# Altium footprint library Vowstar_Module.PcbLib: 57 footprints (part 2 of 4)
Each footprint in its own frame and in the unit in brackets; x right, y up, seen from the top. Pads: shape width x height; smd on the part's side, far side on the other; paste and mask are expansions set on the pad; w line width, h text height; cw(c..) or ccw(c..) is an arc to the next point about the centre after c.
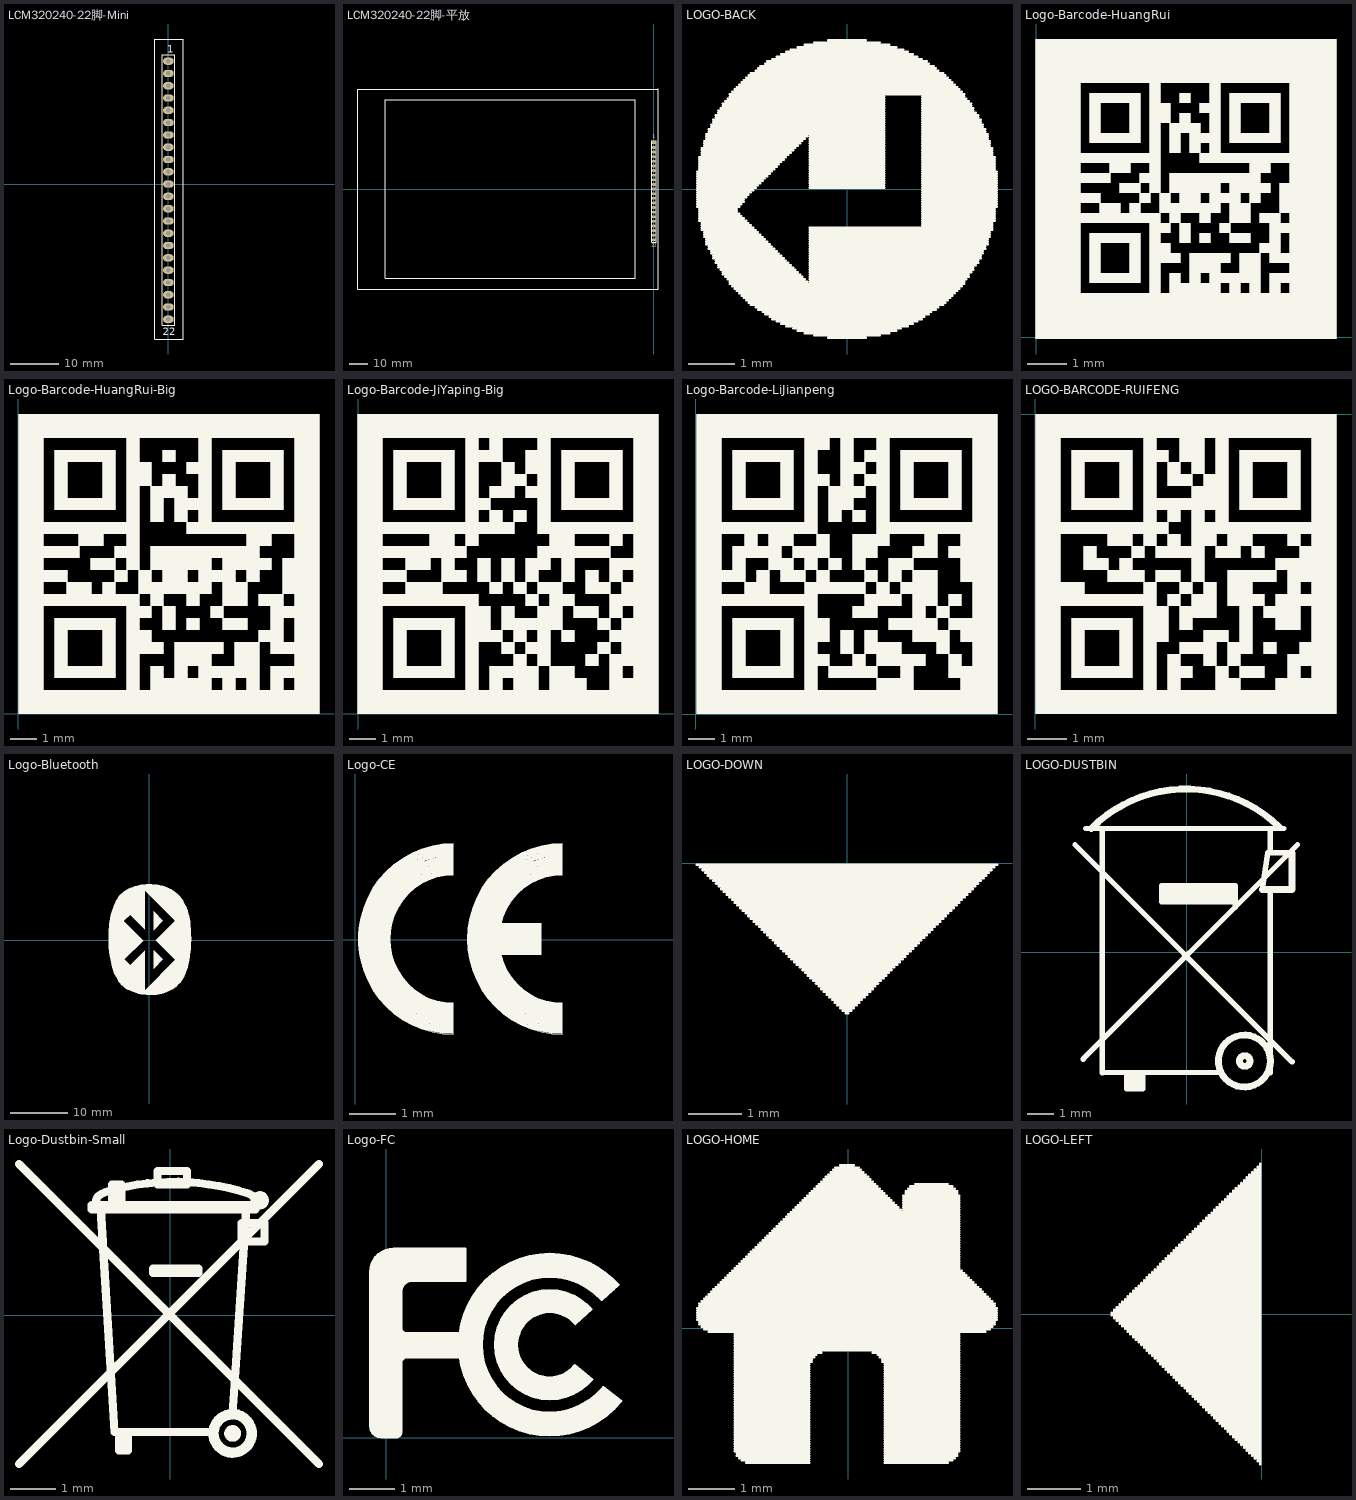
[diagram p1: the footprints below, top view; thin cyan lines are the x and y axes]

## LCM320240-22脚-Mini [mm] "LCM320240-22脚"
height 7.62
pads (22):
  oval 2.2x1.5 hole 0.9: 1(0,25.4) 2(0,22.86) 3(0,20.32) 4(0,17.78) 5(0,15.24) 6(0,12.7) 7(0,10.16) 8(0,7.62) 9(0,5.08) 10(0,2.54) 11(0,0) 12(0,-2.54) 13(0,-5.08) 14(0,-7.62) 15(0,-10.16) 16(0,-12.7) 17(0,-15.24) 18(0,-17.78) 19(0,-20.32) 20(0,-22.86) 21(0,-25.4) 22(0,-27.94)
Top Overlay:
  lines w0.2: -1.27,-29.21 1.27,-29.21 1.27,26.67 -1.27,26.67 -1.27,-29.21
  lines w0.254: -2.794,-32.004 -2.794,29.972 3.048,29.972 3.048,-32.004 -2.794,-32.004
  text "1" at -0.254,27.178 h1.52
  text "22" at -1.143,-31.242 h1.52

## LCM320240-22脚-平放 [mm] "LCM320240-22脚-平放"
height 7.62
pads (22):
  oval 2.2x1.5 hole 0.9: 1(0,25.4) 2(0,22.86) 3(0,20.32) 4(0,17.78) 5(0,15.24) 6(0,12.7) 7(0,10.16) 8(0,7.62) 9(0,5.08) 10(0,2.54) 11(0,0) 12(0,-2.54) 13(0,-5.08) 14(0,-7.62) 15(0,-10.16) 16(0,-12.7) 17(0,-15.24) 18(0,-17.78) 19(0,-20.32) 20(0,-22.86) 21(0,-25.4) 22(0,-27.94)
Top Overlay:
  lines w0.2: -1.27,-29.21 -1.27,26.67 1.27,26.67 1.27,-29.21 -1.27,-29.21
  lines w0.254: -162.714,-55.009 -162.714,54.991 2.286,54.991 ; -162.714,-54.991 2.286,-54.991 2.286,55.049 ; -147.828,-49.149 -10.287,-49.149 -10.287,49.149 -147.828,49.149 -147.828,-49.149
  text "1" at -0.508,28.321 h1.52
  text "22" at -1.143,-31.75 h1.52

## LOGO-BACK [mm] "LOGO-BACK"
Top Overlay:
  drawing of 231 lines, arcs and shapes, not listed

## Logo-Barcode-HuangRui [mm] "Logo-Barcode-HuangRui"
Top Overlay:
  drawing of 710 lines, arcs and shapes, not listed

## Logo-Barcode-HuangRui-Big [mm] "Logo-Barcode-HuangRui"
Top Overlay:
  drawing of 822 lines, arcs and shapes, not listed

## Logo-Barcode-JiYaping-Big [mm] "Logo-Barcode-JiYaping"
Top Overlay:
  drawing of 858 lines, arcs and shapes, not listed

## Logo-Barcode-LiJianpeng [mm] "Logo-Barcode-LiJianpeng"
Top Overlay:
  drawing of 858 lines, arcs and shapes, not listed

## LOGO-BARCODE-RUIFENG [mm] "LOGO-BARCODE-RUIFENG"
Top Overlay:
  drawing of 858 lines, arcs and shapes, not listed

## Logo-Bluetooth [mm] "Logo-Bluetooth"
Top Overlay:
  region: 0.762,5.029 0.762,1.778 2.388,3.404
  region: 0.762,-1.676 0.762,-4.928 2.388,-3.302
  region: -1.041,-0.025 -4.394,-3.378 -4.394,3.327
  region: -4.343,-3.277 -3.2,-4.42 -4.343,-4.42
  region: -3.2,4.521 -4.445,3.277 -4.445,4.521
  region: -4.115,5.283 -0.762,8.687 -0.762,1.93
  region: -4.115,-5.182 -0.762,-1.829 -0.762,-8.534
  region: 1.118,0.051 4.496,3.429 4.572,-3.404
  region: -0.864,-8.788 4.623,-3.302 3.378,-7.417
  region: 4.648,3.251 -0.838,8.738 3.277,7.493
  region: -0.406,9.627 -2.769,9.144 -4.42,8.204 -5.232,7.315 -5.994,6.096 -6.299,5.258 -6.629,4.089 -6.731,3.048 -6.909,1.727 -6.858,-1.321 -6.655,-2.819 -6.274,-4.801 -5.817,-6.045 -4.877,-7.468 -3.886,-8.255 -1.778,-9.22 -0.737,-9.322 -0.762,-8.484 -3.327,-4.343 -4.394,-3.251 -4.394,3.632 -2.997,4.699 -0.737,8.738 -0.406,9.601
  region: -1.194,-9.22 -0.508,-9.322 0.762,-9.347 1.753,-9.246 3.048,-8.865 3.912,-8.458 4.674,-7.849 5.385,-7.061 6.02,-6.071 6.528,-4.597 6.883,-3.277 7.112,-1.549 7.163,0.33 7.087,1.803 7.01,3.073 6.807,4.191 6.553,5.232 6.147,6.172 5.588,7.137 5.029,7.772 4.42,8.306 3.277,8.992 2.388,9.296 1.6,9.474 0.508,9.601 -0.178,9.627 -0.889,9.55 -0.889,8.814 0.279,7.899 4.521,3.607 4.445,3.2 2.388,0.483 4.597,-3.404
  lines w0.254: -6.934,0.203 ccw(c11.215,0.203) -6.231,-4.801 ; -6.935,0.267 cw(c11.214,0.267) -6.231,5.27 ; -6.569,-0.24 cw(c2.959,1.968) -5.58,6.737 ; -6.248,5.182 cw(c-0.978,4.077) -0.939,9.462 ; -6.172,-4.851 ccw(c-0.902,-3.746) -0.862,-9.131 ; -5.805,-5.937 cw(c0.597,-2.756) -5.537,0.914 ; -5.461,-5.613 ccw(c-2.007,-5.385) -1.778,-8.839 ; -4.14,8.458 cw(c0,1.676) 3.281,8.913 ; -4.013,-8.204 ccw(c0.025,-1.549) 3.578,-8.476 ; 0.076,-9.296 ccw(c0.762,-3.505) 6.553,-4.191 ; 1.041,9.55 cw(c0.724,3.569) 6.706,3.251 ; 4.572,-4.801 ccw(c0.8,0.318) 5.918,4.089 ; 5.621,-6.726 ccw(c-0.889,-2.489) 6.477,-0.025 ; 5.976,6.41 cw(c-2.654,1.867) 7.061,2.718 ; 6.477,-4.75 ccw(c-1.778,-1.803) 6.672,0.527 ; 6.745,-3.718 ccw(c-7.68,-0.33) 7.137,-0.33 ; 6.745,4.226 cw(c-7.68,0.838) 7.137,0.838

## Logo-CE [mm] "Logo-CE"
Top Overlay:
  drawing of 615 lines, arcs and shapes, not listed

## LOGO-DOWN [mm] "LOGO-DOWN"
Top Overlay:
  lines w0.051: -2.819,-0.025 2.819,-0.025 ; -2.769,-0.076 2.769,-0.076 ; -2.718,-0.127 2.718,-0.127 ; -2.667,-0.178 2.667,-0.178 ; -2.616,-0.229 2.616,-0.229 ; -2.565,-0.279 2.565,-0.279 ; -2.515,-0.33 2.515,-0.33 ; -2.464,-0.381 2.464,-0.381 ; -2.413,-0.432 2.413,-0.432 ; -2.362,-0.483 2.362,-0.483 ; -2.311,-0.533 2.311,-0.533 ; -2.261,-0.584 2.261,-0.584 ; -2.21,-0.635 2.21,-0.635 ; -2.159,-0.686 2.159,-0.686 ; -2.108,-0.737 2.108,-0.737 ; -2.057,-0.787 2.057,-0.787 ; -2.007,-0.838 2.007,-0.838 ; -1.956,-0.889 1.956,-0.889 ; -1.905,-0.94 1.905,-0.94 ; -1.854,-0.991 1.854,-0.991 ; -1.803,-1.041 1.803,-1.041 ; -1.753,-1.092 1.753,-1.092 ; -1.702,-1.143 1.702,-1.143 ; -1.651,-1.194 1.651,-1.194 ; -1.6,-1.245 1.6,-1.245 ; -1.549,-1.295 1.549,-1.295 ; -1.499,-1.346 1.499,-1.346 ; -1.448,-1.397 1.448,-1.397 ; -1.397,-1.448 1.397,-1.448 ; -1.346,-1.499 1.346,-1.499 ; -1.295,-1.549 1.295,-1.549 ; -1.245,-1.6 1.245,-1.6 ; -1.194,-1.651 1.194,-1.651 ; -1.143,-1.702 1.143,-1.702 ; -1.092,-1.753 1.092,-1.753 ; -1.041,-1.803 1.041,-1.803 ; -0.991,-1.854 0.991,-1.854 ; -0.94,-1.905 0.94,-1.905 ; -0.889,-1.956 0.889,-1.956 ; -0.838,-2.007 0.838,-2.007 ; -0.787,-2.057 0.787,-2.057 ; -0.737,-2.108 0.737,-2.108 ; -0.686,-2.159 0.686,-2.159 ; -0.635,-2.21 0.635,-2.21 ; -0.584,-2.261 0.584,-2.261 ; -0.533,-2.311 0.533,-2.311 ; -0.483,-2.362 0.483,-2.362 ; -0.432,-2.413 0.432,-2.413 ; -0.381,-2.464 0.381,-2.464 ; -0.33,-2.515 0.33,-2.515 ; -0.279,-2.565 0.279,-2.565 ; -0.229,-2.616 0.229,-2.616 ; -0.178,-2.667 0.178,-2.667 ; -0.127,-2.718 0.127,-2.718 ; -0.076,-2.769 0.076,-2.769 ; -0.025,-2.819 0.025,-2.819

## LOGO-DUSTBIN [mm] "LOGO-DUSTBIN"
Top Overlay:
  circle w0.254: c2.166,-4.064 r0.2
  circle w0.254: c2.155,-4.064 r0.974
  lines w0.2: -4.187,4.032 3.941,-4.096 ; -3.882,-3.994 4.144,4.032 ; -3.78,4.642 3.636,4.642 ; -3.171,4.642 -3.171,-4.502 1.27,-4.496 ; -2.256,-5.01 -1.647,-5.01 ; -2.256,-4.909 -1.647,-4.909 ; -2.256,-4.807 -1.647,-4.807 ; -2.256,-4.705 -1.647,-4.705 ; -2.256,-4.604 -1.647,-4.604 ; -2.256,-4.502 -2.256,-5.112 -1.647,-5.112 -1.647,-4.502 ; -2.155,-5.112 -2.155,-4.502 ; -2.053,-5.112 -2.053,-4.502 ; -1.952,-5.112 -1.952,-4.502 ; -1.85,-5.112 -1.85,-4.502 ; -1.748,-5.112 -1.748,-4.502 ; -0.936,2 1.808,2 ; -0.936,2.102 1.808,2.102 ; -0.936,2.203 1.808,2.203 ; -0.936,2.305 1.808,2.305 ; -0.936,2.407 1.808,2.407 ; -0.834,1.899 -0.834,2.508 ; -0.732,1.899 -0.732,2.508 ; -0.631,1.899 -0.631,2.508 ; -0.529,1.899 -0.529,2.508 ; -0.428,1.899 -0.428,2.508 ; -0.326,1.899 -0.326,2.508 ; -0.224,1.899 -0.224,2.508 ; -0.123,1.899 -0.123,2.508 ; -0.021,1.899 -0.021,2.508 ; 0.08,1.899 0.08,2.508 ; 0.182,1.899 0.182,2.508 ; 0.284,1.899 0.284,2.508 ; 0.385,1.899 0.385,2.508 ; 0.487,1.899 0.487,2.508 ; 0.588,1.899 0.588,2.508 ; 0.69,1.899 0.69,2.508 ; 0.792,1.899 0.792,2.508 ; 0.893,1.899 0.893,2.508 ; 0.995,1.899 0.995,2.508 ; 1.096,1.899 1.096,2.508 ; 1.198,1.899 1.198,2.508 ; 1.3,1.899 1.3,2.508 ; 1.401,1.899 1.401,2.508 ; 1.503,1.899 1.503,2.508 ; 1.604,1.899 1.604,2.508 ; 1.706,1.899 1.706,2.508 ; 1.808,1.695 1.808,2.508 -0.936,2.508 -0.936,1.899 1.808,1.899 ; 1.808,1.797 1.909,1.797 ; 2.819,2.362 3.027,3.727 3.941,3.727 ; 3.128,-4.502 3.128,2.305 ; 3.128,3.727 3.128,4.642
  lines w0.254: -3.581,4.642 cw(c-0.032,1.121) 3.46,4.7 ; 2.819,2.362 3.937,2.362 3.941,3.727

## Logo-Dustbin-Small [mm] "Logo-Dustbin-Small"
Top Overlay:
  drawing of 436 lines, arcs and shapes, not listed

## Logo-FC [mm] "Logo-FC"
Top Overlay:
  drawing of 657 lines, arcs and shapes, not listed

## LOGO-HOME [mm] "LOGO-HOME"
Top Overlay:
  drawing of 188 lines, arcs and shapes, not listed

## LOGO-LEFT [mm] "LOGO-LEFT"
Top Overlay:
  lines w0.051: -2.819,-0.025 -2.819,0.025 ; -2.769,-0.076 -2.769,0.076 ; -2.718,-0.127 -2.718,0.127 ; -2.667,-0.178 -2.667,0.178 ; -2.616,-0.229 -2.616,0.229 ; -2.565,-0.279 -2.565,0.279 ; -2.515,-0.33 -2.515,0.33 ; -2.464,-0.381 -2.464,0.381 ; -2.413,-0.432 -2.413,0.432 ; -2.362,-0.483 -2.362,0.483 ; -2.311,-0.533 -2.311,0.533 ; -2.261,-0.584 -2.261,0.584 ; -2.21,-0.635 -2.21,0.635 ; -2.159,-0.686 -2.159,0.686 ; -2.108,-0.737 -2.108,0.737 ; -2.057,-0.787 -2.057,0.787 ; -2.007,-0.838 -2.007,0.838 ; -1.956,-0.889 -1.956,0.889 ; -1.905,-0.94 -1.905,0.94 ; -1.854,-0.991 -1.854,0.991 ; -1.803,-1.041 -1.803,1.041 ; -1.753,-1.092 -1.753,1.092 ; -1.702,-1.143 -1.702,1.143 ; -1.651,-1.194 -1.651,1.194 ; -1.6,-1.245 -1.6,1.245 ; -1.549,-1.295 -1.549,1.295 ; -1.499,-1.346 -1.499,1.346 ; -1.448,-1.397 -1.448,1.397 ; -1.397,-1.448 -1.397,1.448 ; -1.346,-1.499 -1.346,1.499 ; -1.295,-1.549 -1.295,1.549 ; -1.245,-1.6 -1.245,1.6 ; -1.194,-1.651 -1.194,1.651 ; -1.143,-1.702 -1.143,1.702 ; -1.092,-1.753 -1.092,1.753 ; -1.041,-1.803 -1.041,1.803 ; -0.991,-1.854 -0.991,1.854 ; -0.94,-1.905 -0.94,1.905 ; -0.889,-1.956 -0.889,1.956 ; -0.838,-2.007 -0.838,2.007 ; -0.787,-2.057 -0.787,2.057 ; -0.737,-2.108 -0.737,2.108 ; -0.686,-2.159 -0.686,2.159 ; -0.635,-2.21 -0.635,2.21 ; -0.584,-2.261 -0.584,2.261 ; -0.533,-2.311 -0.533,2.311 ; -0.483,-2.362 -0.483,2.362 ; -0.432,-2.413 -0.432,2.413 ; -0.381,-2.464 -0.381,2.464 ; -0.33,-2.515 -0.33,2.515 ; -0.279,-2.565 -0.279,2.565 ; -0.229,-2.616 -0.229,2.616 ; -0.178,-2.667 -0.178,2.667 ; -0.127,-2.718 -0.127,2.718 ; -0.076,-2.769 -0.076,2.769 ; -0.025,-2.819 -0.025,2.819